# Altium footprint library Mylib.PcbLib: 294 footprints (part 7 of 19)
Each footprint in its own frame and in the unit in brackets; x right, y up, seen from the top. Pads: shape width x height; smd on the part's side, far side on the other; paste and mask are expansions set on the pad; w line width, h text height; cw(c..) or ccw(c..) is an arc to the next point about the centre after c.
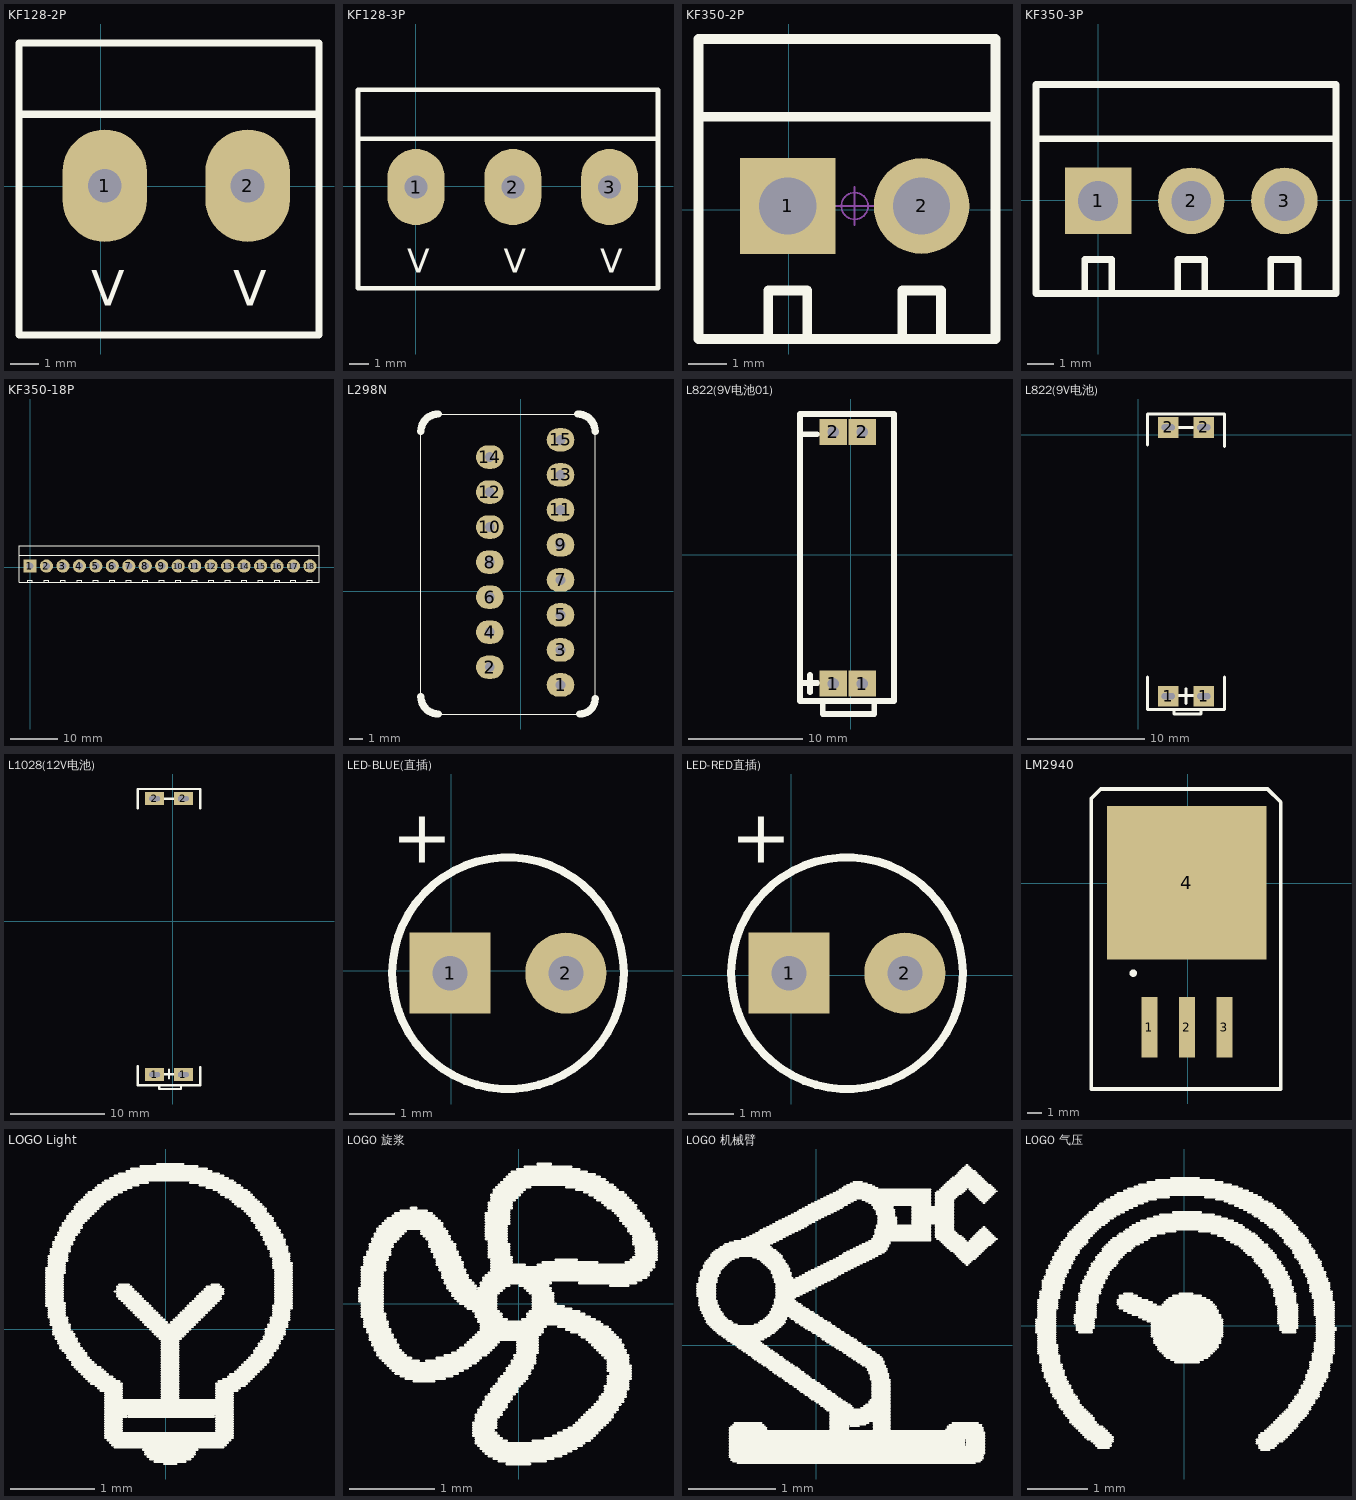
[diagram p6: the footprints below, top view; thin cyan lines are the x and y axes]

## KF128-2P [mm]
pads (2):
  oval 3x4 hole 1.2: 1(0.134,0.024) 2(5.214,0.024)
Top Overlay:
  lines w0.254: -2.914,2.564 7.754,2.564 ; -2.914,-5.285 -2.914,5.1 7.754,5.1 7.754,-5.285 -2.914,-5.285
  text "V" at 4.706,-4.245 h1.27
  text "V" at -0.347,-4.245 h1.27
3D body "KF128-5.08-.STEP": height 14.15, standoff -3.95, extent -2.914,-5.353 2.666,5.147
3D body "KF128-5.08-.STEP": height 14.15, standoff -3.95, extent 2.166,-5.353 7.746,5.147

## KF128-3P [mm]
pads (3):
  oval 3x4 hole 1.2: 1(0.025,-0.05) 2(5.105,-0.05) 3(10.185,-0.05)
Top Overlay:
  lines w0.254: -3.023,2.49 12.725,2.49 ; -3.023,-5.359 12.725,-5.359 12.725,5.055 -3.023,5.055 -3.023,-5.359
  text "V" at 9.681,-4.545 h1.27
  text "V" at 4.628,-4.545 h1.27
  text "V" at -0.425,-4.545 h1.27
3D body "KF128-5.08-.STEP": height 14.15, standoff -3.95, extent 7.144,-5.434 12.724,5.066
3D body "KF128-5.08-.STEP": height 14.15, standoff -3.95, extent 2.064,-5.434 7.644,5.066
3D body "KF128-5.08-.STEP": height 14.15, standoff -3.95, extent -3.016,-5.434 2.564,5.066

## KF350-2P [mm]
pads (2):
  rect 2.5x2.5 hole 1.5: 1(-0.023,0.102)
  round 2.5 hole 1.5: 2(3.477,0.102)
Top Overlay:
  lines w0.254: -2.36,2.438 5.413,2.438 ; -0.531,-3.378 -0.531,-2.108 0.485,-2.108 0.485,-3.378 ; 2.969,-3.378 2.969,-2.108 3.985,-2.108 3.985,-3.378 ; -2.36,-3.378 -2.36,4.47 5.413,4.47 5.413,-3.378 -2.36,-3.378
Mechanical 15:
  circle w0.05: c1.727,0.102 r0.35
  lines w0.05: 1.227,0.102 2.227,0.102 ; 1.727,-0.398 1.727,0.602
3D body "KF350.STEP": height 10, standoff -3.8, extent 1.327,-3.198 5.227,4.302
3D body "KF350.STEP": height 10, standoff -3.8, extent -2.173,-3.198 1.727,4.302

## KF350-3P [mm]
pads (3):
  rect 2.5x2.5 hole 1.5: 1(0,-0.025)
  round 2.5 hole 1.5: 2(3.5,-0.025) 3(7,-0.025)
Top Overlay:
  lines w0.254: -2.337,2.311 8.941,2.311 ; -0.508,-3.505 -0.508,-2.235 0.508,-2.235 0.508,-3.505 ; 2.992,-3.505 2.992,-2.235 4.008,-2.235 4.008,-3.505 ; 6.492,-3.505 6.492,-2.235 7.508,-2.235 7.508,-3.505 ; -2.337,-3.505 8.941,-3.505 8.941,4.343 -2.337,4.343 -2.337,-3.505
3D body "KF350.STEP": height 10, standoff -3.8, extent -2.147,-3.369 1.753,4.131
3D body "KF350.STEP": height 10, standoff -3.8, extent 1.353,-3.369 5.253,4.131
3D body "KF350.STEP": height 10, standoff -3.8, extent 4.853,-3.369 8.753,4.131

## KF350-18P [mil]
pads (18):
  rect 110x110 hole 59.06: 1(-1.14,8.5)
  round 110 hole 59.06: 2(136.65,8.5) 3(274.45,8.51) 4(412.25,8.51) 5(550.04,8.51) 6(687.84,8.51) 7(825.63,8.5) 8(963.43,8.5) 9(1101.22,8.5) 10(1239.02,8.5) 11(1376.81,8.5) 12(1514.61,8.5) 13(1652.4,8.5) 14(1790.2,8.5) 15(1927.99,8.5) 16(2065.99,8.5) 17(2203.74,8.5) 18(2341.54,8.5)
Top Overlay:
  lines w10: -93.14,100.5 1039.86,100.5 1176.14,100.5 ; -21.14,-128.5 -21.14,-111.5 18.86,-111.5 18.86,-128.5 ; 116.65,-128.5 116.65,-111.5 156.65,-111.5 156.65,-128.5 ; 254.45,-128.49 254.45,-111.5 294.45,-111.5 294.45,-128.49 ; 392.25,-128.49 392.25,-111.5 432.25,-111.5 432.25,-128.49 ; 530.04,-128.49 530.04,-111.5 570.04,-111.5 570.04,-128.49 ; 667.86,-128.5 667.86,-111.5 707.86,-111.5 707.86,-128.5 ; 805.86,-128.5 805.86,-111.5 845.86,-111.5 845.86,-128.5 ; 943.86,-128.5 943.86,-111.5 983.86,-111.5 983.86,-128.5 ; 1081.65,-128.5 1081.65,-111.5 1121.65,-111.5 1121.65,-128.5 ; 1177.65,100.5 1313.94,100.5 ; 1219.45,-128.5 1219.45,-111.5 1259.45,-111.5 1259.45,-128.5 ; 1315.45,100.5 1451.73,100.5 ; 1357.25,-128.5 1357.25,-111.5 1397.25,-111.5 1397.25,-128.5 ; 1453.25,100.5 1589.53,100.5 ; 1495.04,-128.5 1495.04,-111.5 1535.04,-111.5 1535.04,-128.5 ; 1591.04,100.5 1727.32,100.5 ; 1632.84,-128.5 1632.84,-111.5 1672.84,-111.5 1672.84,-128.5 ; 1728.84,100.5 1865.12,100.5 ; 1770.63,-128.5 1770.63,-111.5 1810.63,-111.5 1810.63,-128.5 ; 1866.63,100.5 2002.91,100.5 ; 1908.43,-128.5 1908.43,-111.5 1948.43,-111.5 1948.43,-128.5 ; 1996.63,100.5 2416.34,100.39 ; 2046.43,-128.5 2046.43,-111.5 ; 2047.43,-111.5 2087.43,-111.5 2087.43,-128.5 ; 2181.27,-126.53 2181.27,-109.53 ; 2182.27,-109.53 2222.27,-109.53 2222.27,-126.53 ; 2319.06,-127.51 2319.06,-110.51 ; 2320.06,-110.51 2360.06,-110.51 2360.06,-127.51 ; -93.14,-128.5 -93.14,180.5 1039.86,180.5 1177.65,180.5 1315.45,180.5 1453.25,180.5 1591.04,180.5 1728.84,180.5 1866.63,180.5 2417.32,180.5 2417.32,-128.5 1866.63,-128.5 1728.84,-128.5 1591.04,-128.5 1453.25,-128.5 1315.45,-128.5 1177.65,-128.5 1039.86,-128.5 -93.14,-128.5

## L298N [mm]
pads (15):
  oval 2x1.7 hole 0.712: 1(2.87,-6.807) 2(-2.261,-5.512) 3(2.87,-4.267) 4(-2.261,-2.972) 5(2.87,-1.727) 6(-2.261,-0.432) 7(2.87,0.813) 8(-2.261,2.108) 9(2.87,3.353) 10(-2.261,4.648) 11(2.87,5.893) 12(-2.261,7.188) 13(2.87,8.433) 14(-2.261,9.728) 15(2.87,10.973)
Top Overlay:
  lines w0.076: -7.264,-7.645 -7.264,11.582 ; -5.994,-8.915 4.267,-8.915 ; -5.994,12.852 4.115,12.852 ; 5.385,-7.925 5.385,11.582
  lines w0.54: -7.264,-7.645 ccw(c-5.994,-7.645) -5.994,-8.915 ; -7.264,11.582 cw(c-5.994,11.582) -5.994,12.852 ; 4.115,12.852 cw(c4.115,11.582) 5.385,11.582 ; 4.267,-8.915 ccw(c4.267,-7.798) 5.385,-7.798
3D body "User Library-Multiwatt15V.STEP": height 21.3, standoff -1, extent -6.883,-7.666 3.007,11.934

## L822(9V电池01) [mil]
pads (4):
  rect 95x90 hole 40: 1(-60,-445) 1(40,-445) 2(-60,423) 2(40,423)
Top Overlay:
  lines w20: -165,-442.72 -115,-442.72 ; -165,415 -115.94,415 ; -140.63,-475 -140.63,-415 ; -95.94,-510.51 -95.94,-549.88 81.22,-549.88 81.22,-510.51 ; -175,-505 -175,-145.55 -175,485 150,485 150,-505 -175,-505

## L822(9V电池) [mil]
pads (4):
  rect 70x70 hole 20 slot 45 at 0 deg: 1(100,-880) 1(220,-880) 2(100,25) 2(220,25)
Top Overlay:
  lines w10: 30,-815 30,-925 290,-925 290,-815 ; 30,-35 30,70 290,70 290,-40 ; 120,-930 120,-940 210,-940 210,-930 ; 135,25 184.06,25 ; 135.63,-877.72 185.63,-877.72 ; 160,-905 160,-855

## L1028(12V电池) [mil]
pads (4):
  rect 80x55 hole 20 slot 45 at 0 deg: 1(-75,-640) 1(45,-640) 2(-75,510) 2(45,510)
Top Overlay:
  lines w10: -145,-605 -145,-685 115,-685 115,-610 ; -145,470 -145,550 115,550 115,470 ; -55,-690 -55,-700 35,-700 35,-690 ; -40,510 9.06,510 ; -39.37,-637.72 10.63,-637.72 ; -15,-655 -15,-620

## LED-BLUE(直插) [mil]
pads (2):
  rect 70x70 hole 30: 1(-0.98,-1.97)
  round 70 hole 30: 2(99.02,-1.97)
Top Overlay:
  circle w7: c49.02,-1.97 r100
  text "+" at 1.39,78.32 h78.74
3D body: height 204.72, standoff -78.74, extent -21.65,-79.72 116.93,77.76

## LED-RED直插) [mil]
pads (2):
  rect 70x70 hole 30: 1(-1.97,1.97)
  round 70 hole 30: 2(98.03,1.97)
Top Overlay:
  circle w7: c48.03,1.97 r100
  text "+" at 0.41,82.26 h78.74
3D body: height 204.72, standoff -78.74, extent -19.68,-76.76 118.9,80.71

## LM2940 [mm]
pads (4):
  rect 1.1x4.1 smd: 1(-2.591,-9.732) 2(-0.051,-9.732) 3(2.489,-9.732)
  rect 10.8x10.41 smd: 4(-0.051,0.047)
Top Overlay:
  circle w0.25: c-3.691,-6.076 r0.125
  lines w0.254: -6.528,-13.923 -6.528,5.762 -5.893,6.397 5.41,6.397 6.299,5.508 6.299,-13.923 -6.528,-13.923
3D body: height 5, standoff 0, extent -6.2,-5.2 6,6.2

## LOGO Light [mm]
Top Overlay:
  drawing of 294 lines, arcs and shapes, not listed

## LOGO 旋浆 [mm]
Top Overlay:
  drawing of 310 lines, arcs and shapes, not listed

## LOGO 机械臂 [mm]
Top Overlay:
  drawing of 443 lines, arcs and shapes, not listed

## LOGO 气压 [mm]
Top Overlay:
  drawing of 390 lines, arcs and shapes, not listed